# Altium integrated library BYTECH_HW_LIB_2019.IntLib: 907 symbols (part 4 of 6)
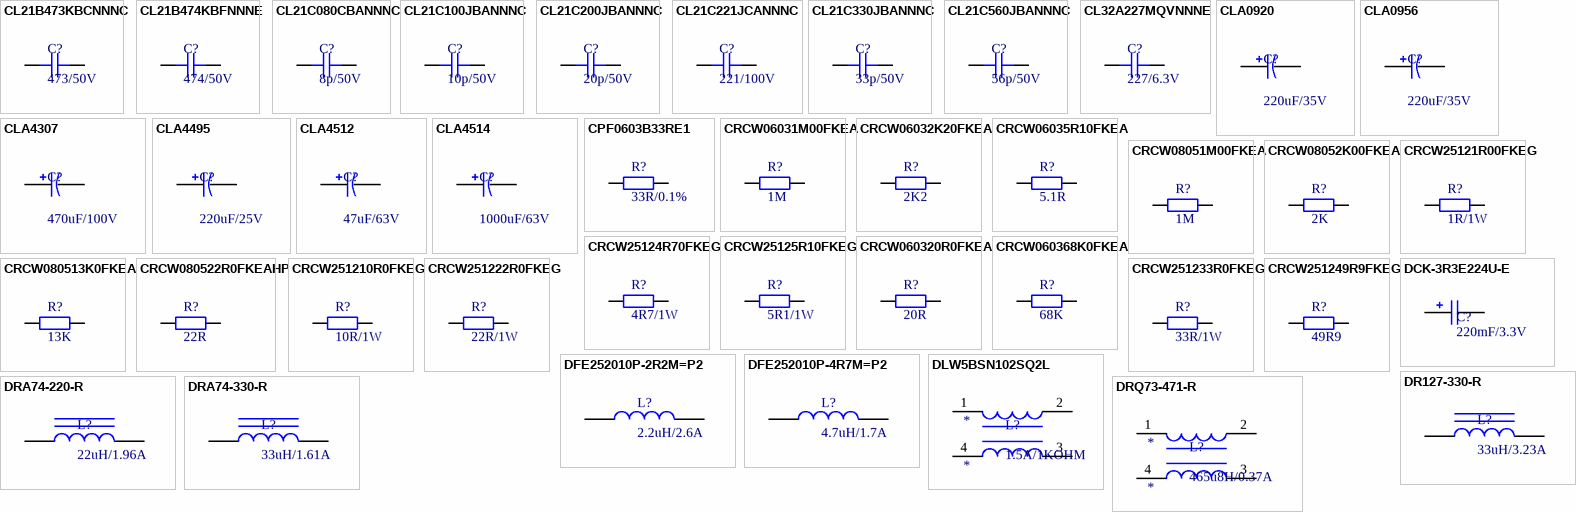
[diagram p42: symbols CL21B473KBCNNNC to DRQ73-471-R]

## CLA0920
designator C?, comment 220uF/35V
CAP ALUM 220uF 20% 10V RADIAL; MPN: CLA0920; Solder: WAVE; Value: 220uF/35V; Category: CAPACITOR; MFR_URL: http://linhkienchatluong.vn/tu-hoa-co-phan-cuc/tu-hoa-10v-220uf_sp454_ct825.aspx; PinCount: 2
footprint CAP_ALUM_D050_S20_H110
pins: 1, 2
1 alternate drawing of the same symbol

## CLA0956
designator C?, comment 220uF/35V
CAP ALUM 220uF 20% 35V RADIAL; MPN: CLA0956; Solder: WAVE; Value: 220uF/35V; Category: CAPACITOR; MFR_URL: https://linhkienchatluong.vn/tu-hoa-co-phan-cuc/tu-hoa-35v-220uf-8x12mm-tan-so-cao_sp454_ct929.aspx; PinCount: 2
footprint CAP_ALUM_D080_S35_H115
pins: 1, 2
1 alternate drawing of the same symbol

## CLA4307
designator C?, comment 470uF/100V
CAP ALUM 470uF 20% 100V RADIAL; MPN: CLA4307; Solder: WAVE; Value: 470uF/100V; Category: CAPACITOR; MFR_URL: http://linhkienchatluong.vn/tu-hoa-chat-luong-cao/tu-hoa-63v-47uf-nipponlelon-8x11mm_sp977_ct6500.aspx; PinCount: 2
footprint CAP_ALUM_D160_S75_H250
pins: 1, 2
1 alternate drawing of the same symbol

## CLA4495
designator C?, comment 220uF/25V
CAP ALUM 220uF 20% 25V RADIAL; MPN: CLA4495; Solder: WAVE; Value: 220uF/25V; Category: CAPACITOR; MFR_URL: http://linhkienchatluong.vn/tu-hoa-chat-luong-cao/tu-hoa-25v-220uf-elite-8x11mm_sp977_ct6482.aspx; PinCount: 2
footprint CAP_ALUM_D080_S35_H115
pins: 1, 2
1 alternate drawing of the same symbol

## CLA4512
designator C?, comment 47uF/63V
CAP ALUM 47uF 20% 63V RADIAL; MPN: CLA4512; Solder: WAVE; Value: 47uF/63V; Category: CAPACITOR; MFR_URL: http://linhkienchatluong.vn/tu-hoa-chat-luong-cao/tu-hoa-63v-47uf-nipponlelon-8x11mm_sp977_ct6500.aspx; PinCount: 2
footprint CAP_ALUM_D080_S35_H115
pins: 1, 2
1 alternate drawing of the same symbol

## CLA4514
designator C?, comment 1000uF/63V
CAP ALUM 1000uF 20% 63V RADIAL; MPN: CLA4514; Solder: WAVE; Value: 1000uF/63V; Category: CAPACITOR; MFR_URL: http://linhkienchatluong.vn/tu-hoa-chat-luong-cao/tu-hoa-63v-47uf-nipponlelon-8x11mm_sp977_ct6500.aspx; PinCount: 2
footprint CAP_ALUM_D160_S75_H250
pins: 1, 2
1 alternate drawing of the same symbol

## CPF0603B33RE1
designator R?, comment 33R/0.1%
RES SMD 33 OHM 0.1% 1/16W 0603; MPN: CPF0603B33RE1; CompanyID: VT-01175; Solder: SMT; Value: 33R/0.1%; Category: RESISTOR
footprint RESC-0603 (1608) (Resistor, Chip; 1.60 mm L X 0.80 mm W X 0.50 mm H body)
pins: 1, 2

## CRCW06031M00FKEA
designator R?, comment 1M
RES SMD 1M OHM 1% 1/10W 0603; MPN: CRCW06031M00FKEA; CompanyID: VT-00325; Solder: SMT; Value: 1M; Category: RESISTOR
footprint RESC-0603 (1608) (Resistor, Chip; 1.60 mm L X 0.80 mm W X 0.50 mm H body)
pins: 1, 2

## CRCW06032K20FKEA
designator R?, comment 2K2
RES SMD 2.2K OHM 1% 1/10W 0603; MPN: CRCW06032K20FKEA; CompanyID: VT-00776; Solder: SMT; Value: 2K2; Category: RESISTOR
footprint RESC-0603 (1608) (Resistor, Chip; 1.60 mm L X 0.80 mm W X 0.50 mm H body)
pins: 1, 2

## CRCW06035R10FKEA
designator R?, comment 5.1R
RES SMD 5.1 OHM 1% 1/10W 0603; MPN: CRCW06035R10FKEA; MFR: Vishay Dale; Solder: SMT; Value: 5.1R; Category: RESISTOR; PinCount: 2
footprint RESC-0603 (1608) (Resistor, Chip; 1.60 mm L X 0.80 mm W X 0.50 mm H body)
pins: 1, 2

## CRCW08051M00FKEA
designator R?, comment 1M
RES SMD 1M OHM 1% 1/8W 0805; MPN: CRCW08051M00FKEA; Solder: SMT; CompanyID: VT-00313; Value: 1M; Category: RESISTOR
footprint RESC-0805 (2012) (Resistor, Chip; 2.00 mm L X 1.25 mm W X 0.70 mm H body)
pins: 1, 2

## CRCW08052K00FKEA
designator R?, comment 2K
RES SMD 2K OHM 1% 1/8W 0805; MPN: CRCW08052K00FKEA; Solder: SMT; CompanyID: VT-00874; Value: 2K; Category: RESISTOR
footprint RESC-0805 (2012) (Resistor, Chip; 2.00 mm L X 1.25 mm W X 0.70 mm H body)
pins: 1, 2

## CRCW25121R00FKEG
designator R?, comment 1R/1W
RES SMD 1 OHM 1% 1W 2512; MPN: CRCW25121R00FKEG; Solder: SMT; Value: 1R/1W; Category: RESISTOR
footprint RESC-2512 (6432) (Chip Resistor, Body 6.3x3.2mm, IPC Medium Density)
pins: 1, 2

## CRCW25124R70FKEG
designator R?, comment 4R7/1W
RES SMD 4.7 OHM 1% 1W 2512; MPN: CRCW25124R70FKEG; MFR: Vishay Dale; Solder: SMT; Value: 4R7/1W; Category: RESISTOR; PinCount: 2
footprint RESC-2512 (6432) (Chip Resistor, Body 6.3x3.2mm, IPC Medium Density)
pins: 1, 2

## CRCW25125R10FKEG
designator R?, comment 5R1/1W
RES SMD 5.1 OHM 1% 1W 2512; MPN: CRCW25125R10FKEG; MFR: Vishay Dale; Solder: SMT; Value: 5R1/1W; Category: RESISTOR; PinCount: 2
footprint RESC-2512 (6432) (Chip Resistor, Body 6.3x3.2mm, IPC Medium Density)
pins: 1, 2

## CRCW060320R0FKEA
designator R?, comment 20R
RES SMD 20 OHM 1% 1/10W 0603; MPN: CRCW060320R0FKEA; CompanyID: VT-01023; Solder: SMT; Value: 20R; Category: RESISTOR
footprint RESC-0603 (1608) (Resistor, Chip; 1.60 mm L X 0.80 mm W X 0.50 mm H body)
pins: 1, 2

## CRCW060368K0FKEA
designator R?, comment 68K
RES SMD 68K OHM 1% 1/10W 0603; MPN: CRCW060368K0FKEA; CompanyID: VT-00323; Solder: SMT; Value: 68K; Category: RESISTOR
footprint RESC-0603 (1608) (Resistor, Chip; 1.60 mm L X 0.80 mm W X 0.50 mm H body)
pins: 1, 2

## CRCW080513K0FKEA
designator R?, comment 13K
RES SMD 13K OHM 1% 1/8W 0805; MPN: CRCW080513K0FKEA; Solder: SMT; CompanyID: VT-00011; Value: 13K; Category: RESISTOR
footprint RESC-0805 (2012) (Resistor, Chip; 2.00 mm L X 1.25 mm W X 0.70 mm H body)
pins: 1, 2

## CRCW080522R0FKEAHP
designator R?, comment 22R
RES SMD 22 OHM 1% 1/2W 0805; MPN: CRCW080522R0FKEAHP; Solder: SMT; CompanyID: VT-00213; Value: 22R; Category: RESISTOR
footprint RESC-0805 (2012) (Resistor, Chip; 2.00 mm L X 1.25 mm W X 0.70 mm H body)
pins: 1, 2

## CRCW251210R0FKEG
designator R?, comment 10R/1W
RES SMD 10 OHM 1% 1W 2512; MPN: CRCW251210R0FKEG; MFR: Vishay Dale; Solder: SMT; Value: 10R/1W; Category: RESISTOR; PinCount: 2
footprint RESC-2512 (6432) (Chip Resistor, Body 6.3x3.2mm, IPC Medium Density)
pins: 1, 2

## CRCW251222R0FKEG
designator R?, comment 22R/1W
RES SMD 22 OHM 1% 1W 2512; MPN: CRCW251222R0FKEG; MFR: Vishay Dale; Solder: SMT; Value: 22R/1W; Category: RESISTOR; PinCount: 2
footprint RESC-2512 (6432) (Chip Resistor, Body 6.3x3.2mm, IPC Medium Density)
pins: 1, 2

## CRCW251233R0FKEG
designator R?, comment 33R/1W
RES SMD 33 OHM 1% 1W 2512; MPN: CRCW251222R0FKEG; MFR: Vishay Dale; Solder: SMT; Value: 33R/1W; Category: RESISTOR; PinCount: 2
footprint RESC-2512 (6432) (Chip Resistor, Body 6.3x3.2mm, IPC Medium Density)
pins: 1, 2

## CRCW251249R9FKEG
designator R?, comment 49R9
RES SMD 49.9 OHM 1% 1W 2512; MPN: CRCW251249R9FKEG; Solder: SMT; CompanyID: VT-01314; Value: 49R9; Category: RESISTOR
footprint RESC-2512 (6432) (Chip Resistor, Body 6.3x3.2mm, IPC Medium Density)
pins: 1, 2

## DCK-3R3E224U-E
designator C?, comment 220mF/3.3V
CAP 220mF SUPER -20% +80% 3.3V SMD; MPN: DCK-3R3E224U-E; Solder: HAND; CompanyID: VT-00316; value: 220mF/3.3V; Category: CAPACITOR; PinCount: 2
footprint CAP-SUPER-0.22F
pins: 1, 2

## DFE252010P-2R2M=P2
designator L?, comment 2.2uH/2.6A
FIXED IND 2.2UH 2.6A 115 MOHM; MPN: DFE252010P-2R2M=P2; MFR: Murata Electronics; Solder: SMT; Value: 2.2uH/2.6A; Category: INDUCTOR; PinCount: 2
footprint IND-2520 (Footprint not found)
pins: 1, 2

## DFE252010P-4R7M=P2
designator L?, comment 4.7uH/1.7A
FIXED IND 4.7UH 1.7A 270 MOHM; MPN: DFE252010P-4R7M=P2; MFR: Murata Electronics; Solder: SMT; Value: 4.7uH/1.7A; Category: INDUCTOR; PinCount: 2
footprint IND-2520 (Footprint not found)
pins: 1, 2

## DLW5BSN102SQ2L
designator L?, comment 1.5A/1KOHM
IND- CMC 1.5A 2LN 1 KOHM SMD; MPN: DLW5BSN102SQ2L; CompanyID: VT-00918; Solder: SMT; Value: 1.5A/1KOHM; Category: INDUCTOR
footprint IND-DLW5B-5x5mm
pins: 1, 2, 3, 4

## DR127-330-R
designator L?, comment 33uH/3.23A
IND-FIXED 33uH 3.23A 60 MOHM SMD; MPN: DR127-330-R; CompanyID: VT-00905; Solder: SMT; Value: 33uH/3.23A; Category: INDUCTOR
footprint IND-DR127-330-R-12.5x12.5MM
pins: 1, 2

## DRA74-220-R
designator L?, comment 22uH/1.96A
IND-FIXED 22uH 1.96A 100 MOHM; MPN: DRA74-220-R; CompanyID: VT-00759; Solder: SMT; Value: 22uH/1.96A; Category: INDUCTOR
footprint IND-DRA74-220R-7.6X7.6MM (Inductor 7.6x7.6mm)
pins: 1, 2

## DRA74-330-R
designator L?, comment 33uH/1.61A
IND-FIXED 33uH 1.61A 0.151 OHM; MPN: DRA74-330-R; MFR: Coiltronics / Eaton; Solder: SMT; Value: 33uH/1.61A; Category: INDUCTOR
footprint IND-DRA74-220R-7.6X7.6MM (Inductor 7.6x7.6mm)
pins: 1, 2

## DRQ73-471-R
designator L?, comment 465u8H/0.37A
IND- ARRAY 2 COIL 465.8uH 0.37A SMD; MPN: DRQ73-471-R; Solder: SMT; CompanyID: VT-00758; Value: 465u8H/0.37A; Category: INDUCTOR
footprint INDUCTOR-RDQR73-7.6X7.6MM (Inductor 7.6x7.6mm)
pins: 1, 2, 3, 4

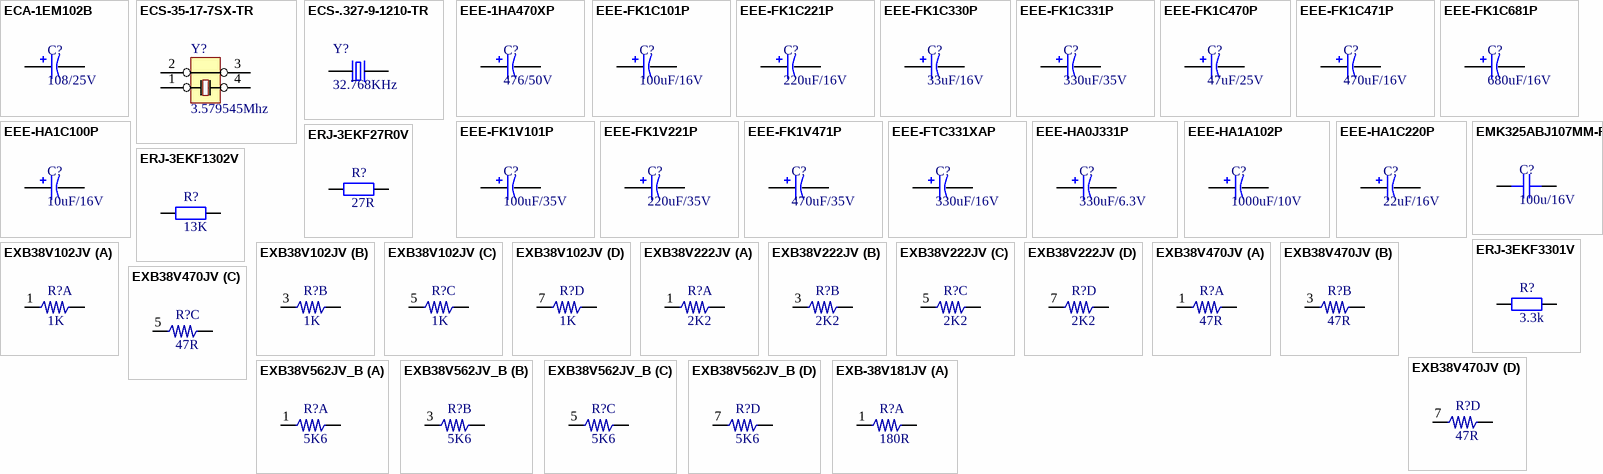
[diagram p21: symbols ECA-1EM102B to EXB-38V181JV]

## ECA-1EM102B
designator C?, comment 108/25V
CAP ALUM 1000uF 20% 25V RADIAL; MPN: ECA-1EM102B; Solder: WAVE; CompanyID: VT-00044; Value: 108/25V; Category: CAPACITOR; PinCount: 2
footprint CAP_ALUM_D100_S50_H200
pins: 1, 2

## ECS-35-17-7SX-TR
designator Y?, comment 3.579545Mhz
CRYSTAL 3.579545MHZ 17PF SMD; MPN: ECS-35-17-7SX-TR; MFR: ECS; Solder: SMT; Value: 3.579545Mhz; Category: CRYSTAL
footprint CRYSTAL_ABS25-32768_4P (CRYSTAL 32.768KHZ 6PF SMD)
pins: 1, 2, 3, 4

## ECS-.327-9-1210-TR
designator Y?, comment 32.768KHz
/ 32.768kHz ±20ppm Crystal 9pF 90 kOhms 2-SMD, No Lead /; MPN: ECS-.327-9-1210-TR; MFR: ECS Inc.; SnapEDA_Link: https://www.snapeda.com/parts/ECS-.327-9-1210-TR/ECS%20Inc./view-part/1592480/?ref=snap; Package: SMD-2 ECS International; Digi-Key_Purchase_URL: https://www.digikey.vn/product-detail/en/ecs-inc/ECS-.327-9-1210-TR/XC2283CT-ND/6821651?utm_source=snapeda&utm_medium=aggregator&utm_campaign=symbol; Digi-Key_Part_Number: XC2283CT-ND; Value: 32.768KHz; Category: Crystal
footprint *XTAL_ECS-.327-9-1210-TR
pins: 1 IN/OUT, 2 OUT/IN

## EEE-1HA470XP
designator C?, comment 476/50V
CAP ALUM 47uF 20% 50V SMD; MPN: EEE-1HA470XP; CompanyID: VT-00558; Solder: SMT; Value: 476/50V; Category: CAPACITOR; PinCount: 2
footprint CAP_ALUM_SMD_6354_TYPE_D8 (Capacitor, Aluminum Electrolytic; 6.60 mm L X 6.60 mm W X 8.00 mm H body)
pins: 1, 2

## EEE-FK1C101P
designator C?, comment 100uF/16V
CAP ALUM 100uF 20% 16V SMD; MPN: EEE-FK1C101P; MFR: Panasonic; Solder: SMT; Value: 100uF/16V; Category: CAPACITOR; PinCount: 2
footprint CAP_ALUM_SMD_6354_TYPE_D (Capacitor, Aluminum Electrolytic; 6.60 mm L X 6.60 mm W X 5.40 mm H body)
pins: 1, 2

## EEE-FK1C221P
designator C?, comment 220uF/16V
CAP ALUM 220uF 20% 16V SMD; MPN: EEE-FK1C221P; MFR: Panasonic; Solder: SMT; Value: 220uF/16V; Category: CAPACITOR; PinCount: 2
footprint CAP_ALUM_SMD_6377_TYPE_D8
pins: 1, 2

## EEE-FK1C330P
designator C?, comment 33uF/16V
CAP ALUM 33uF 20% 16V SMD; MPN: EEE-FK1C330P; MFR: Panasonic; Solder: SMT; Value: 33uF/16V; Category: CAPACITOR; PinCount: 2
footprint CAP_ALUM_SMD_5054_TYPE_C
pins: 1, 2

## EEE-FK1C331P
designator C?, comment 330uF/35V
CAP ALUM 330uF 20% 35V SMD; MPN: EEE-FK1C331P; MFR: Panasonic; Solder: SMT; Value: 330uF/35V; Category: CAPACITOR; PinCount: 2
footprint CAP_ALUM_SMD_100102_TYPE_G
pins: 1, 2

## EEE-FK1C470P
designator C?, comment 47uF/25V
CAP ALUM 47uF 20% 25V SMD; MPN: EEE-FK1C470P; MFR: Panasonic; Solder: SMT; Value: 47uF/25V; Category: CAPACITOR; PinCount: 2
footprint CAP_ALUM_SMD_6354_TYPE_D (Capacitor, Aluminum Electrolytic; 6.60 mm L X 6.60 mm W X 5.40 mm H body)
pins: 1, 2

## EEE-FK1C471P
designator C?, comment 470uF/16V
CAP ALUM 470uF 20% 16V SMD; MPN: EEE-FK1C471P; MFR: Panasonic; Solder: SMT; Value: 470uF/16V; Category: CAPACITOR; PinCount: 2
footprint CAP_ALUM_SMD_80102_TYPE_F
pins: 1, 2

## EEE-FK1C681P
designator C?, comment 680uF/16V
CAP ALUM 680uF 20% 16V SMD; MPN: EEE-FK1C681P; MFR: Panasonic; Solder: SMT; Value: 680uF/16V; Category: CAPACITOR; PinCount: 2
footprint CAP_ALUM_SMD_100102_TYPE_G
pins: 1, 2

## EEE-FK1V101P
designator C?, comment 100uF/35V
CAP ALUM 100uF 20% 35V SMD; MPN: EEE-FK1V101P; MFR: Panasonic; Solder: SMT; Value: 100uF/35V; Category: CAPACITOR; PinCount: 2
footprint CAP_ALUM_SMD_6377_TYPE_D8
pins: 1, 2

## EEE-FK1V221P
designator C?, comment 220uF/35V
CAP ALUM 220uF 20% 35V SMD; MPN: EEE-FK1V221P; MFR: Panasonic; Solder: SMT; Value: 220uF/35V; Category: CAPACITOR; PinCount: 2
footprint CAP_ALUM_SMD_80102_TYPE_F
pins: 1, 2

## EEE-FK1V471P
designator C?, comment 470uF/35V
CAP ALUM 470uF 20% 35V SMD; MPN: EEE-FK1V471P; MFR: Panasonic; Solder: SMT; Value: 470uF/35V; Category: CAPACITOR; PinCount: 2
footprint CAP_ALUM_SMD_100102_TYPE_G
pins: 1, 2

## EEE-FTC331XAP
designator C?, comment 330uF/16V
CAP ALUM 330uF 20% 16V SMD; MPN: EEE-FTC331XAP; MFR: Panasonic; CompanyID: VT-00564; Solder: SMT; Value: 330uF/16V; Category: CAPACITOR; PinCount: 2
footprint CAP_ALUM_SMD_6354_TYPE_D8 (Capacitor, Aluminum Electrolytic; 6.60 mm L X 6.60 mm W X 8.00 mm H body)
pins: 1, 2

## EEE-HA0J331P
designator C?, comment 330uF/6.3V
CAP ALUM 330uF 20% 6.3V SMD; MPN: EEE-HA0J331P; MFR: Panasonic; Solder: SMT; Value: 330uF/6.3V; Category: CAPACITOR; PinCount: 2
footprint CAP_ALUM_SMD_6377_TYPE_D8
pins: 1, 2

## EEE-HA1A102P
designator C?, comment 1000uF/10V
CAP ALUM 1000uF 20% 10V SMD; MPN: EEE-HA1A102P; MFR: Panasonic; Solder: SMT; Value: 1000uF/10V; Category: CAPACITOR; PinCount: 2
footprint CAP_ALUM_SMD_100102_TYPE_G
pins: 1, 2

## EEE-HA1C100P
designator C?, comment 10uF/16V
CAP ALUM 10uF 20% 16V SMD; MPN: EEE-HA1C100P; MFR: Panasonic; Solder: SMT; Value: 10uF/16V; Category: CAPACITOR; PinCount: 2
footprint CAP_ALUM_SMD_4054_TYPE_B
pins: 1, 2

## EEE-HA1C220P
designator C?, comment 22uF/16V
CAP ALUM 22uF 20% 16V SMD; MPN: EEE-HA1C220P; MFR: Panasonic; Solder: SMT; Value: 22uF/16V; Category: CAPACITOR; PinCount: 2
footprint CAP_ALUM_SMD_4054_TYPE_B
pins: 1, 2

## EMK325ABJ107MM-P
designator C?, comment 100u/16V
CAP CER 100UF 16V X5R 1210; MPN: EMK325ABJ107MM-P; MFR: Taiyo Yuden; Solder: SMT; Value: 100u/16V; Category: CAPACITOR; PinCount: 2
footprint CAPC-1210 (3225) (Resistor, Chip; 3.10 mm L X 2.60 mm W X 0.90 mm H body)
pins: 1, 2

## ERJ-3EKF27R0V
designator R?, comment 27R
RES SMD 27 OHM 1% 1/10W 0603; MPN: ERJ-3EKF27R0V; CompanyID: VT-xx; Solder: SMT; Value: 27R; Category: RESISTOR
footprint RESC-0603 (1608) (Resistor, Chip; 1.60 mm L X 0.80 mm W X 0.50 mm H body)
pins: 1, 2

## ERJ-3EKF1302V
designator R?, comment 13K
RES SMD 13K OHM 1% 1/10W 0603; MPN: ERJ-3EKF1302V; CompanyID: VT-00329; Solder: SMT; Value: 13K; Category: RESISTOR
footprint RESC-0603 (1608) (Resistor, Chip; 1.60 mm L X 0.80 mm W X 0.50 mm H body)
pins: 1, 2

## ERJ-3EKF3301V
designator R?, comment 3.3k
RES SMD 3.3k KOHM 1% 1/10W 0603; MPN: ERJ-3EKF3301V; CompanyID: VT-00776; Solder: SMT; Value: 3.3k; Category: RESISTOR
footprint RESC-0603 (1608) (Resistor, Chip; 1.60 mm L X 0.80 mm W X 0.50 mm H body)
pins: 1, 2

## EXB38V102JV
designator R?, comment 1K
RES ARRAY 4 RES 1K OHM 1206 (4X0603); MPN: EXB38V102JV; CompanyID: VT-00784; Solder: SMT; Value: 1K; Category: RESISTOR; PinCount: 8
footprint RESC_ARRAY_4x0603 (Resistor, Chip Array, 2 Side Convex, 0.80 mm pitch; 8 pin, 3.20 mm L X 1.60 mm W X 0.60 mm H body)
part A pins: 1, 2
part B pins: 3, 4
part C pins: 5, 6
part D pins: 7, 8

## EXB38V222JV
designator R?, comment 2K2
RES ARRAY 4 RES 2.2K OHM 1206 (4x0603); MPN: EXB38V222JV; Solder: SMT; Value: 2K2; CompanyID: *; Category: RESISTOR; PinCount: 8
footprint RESC_ARRAY_4x0603 (Resistor, Chip Array, 2 Side Convex, 0.80 mm pitch; 8 pin, 3.20 mm L X 1.60 mm W X 0.60 mm H body)
part A pins: 1, 2
part B pins: 3, 4
part C pins: 5, 6
part D pins: 7, 8

## EXB38V470JV
designator R?, comment 47R
RES ARRAY 4 RES 47 OHM 1206 (4x0603); MPN: EXB-38V470JV; Solder: SMT; Value: 47R; CompanyID: *; Category: RESISTOR; PinCount: 8
footprint RESC_ARRAY_4x0603 (Resistor, Chip Array, 2 Side Convex, 0.80 mm pitch; 8 pin, 3.20 mm L X 1.60 mm W X 0.60 mm H body)
part A pins: 1, 2
part B pins: 3, 4
part C pins: 5, 6
part D pins: 7, 8

## EXB38V562JV_B
designator R?, comment 5K6
RES ARRAY 4 RES 5.6K OHM 1206 (4x0603); MPN: EXB-38V562JV; Solder: SMT; CompanyID: *; Value: 5K6; Category: RESISTOR; PinCount: 8
footprint RESC_ARRAY_4x0603 (Resistor, Chip Array, 2 Side Convex, 0.80 mm pitch; 8 pin, 3.20 mm L X 1.60 mm W X 0.60 mm H body)
part A pins: 1, 2
part B pins: 3, 4
part C pins: 5, 6
part D pins: 7, 8

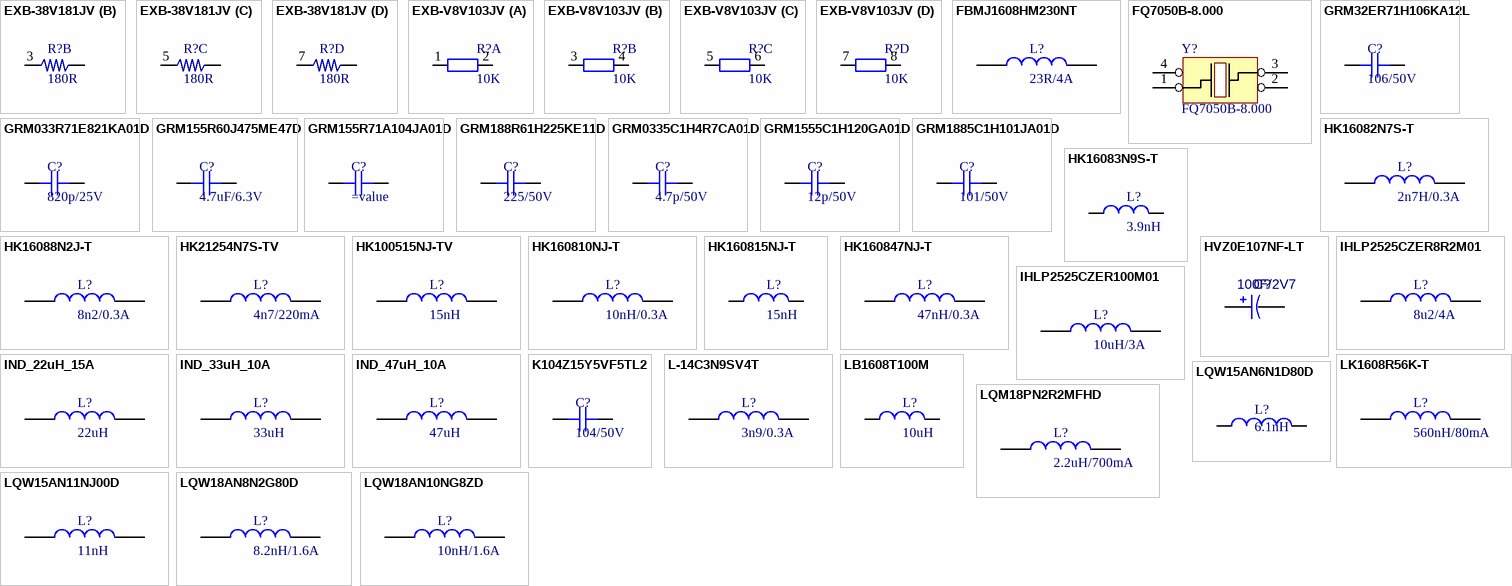
[diagram p22: symbols EXB-38V181JV to LQW18AN10NG8ZD]

## EXB-38V181JV
designator R?, comment 180R
RES ARRAY 4 RES 180 OHM 1206 (4x0603); MPN: EXB-38V181JV; CompanyID: VT-01022; Solder: SMT; Value: 180R; Category: RESISTOR; PinCount: 8
footprint RESC_ARRAY_4x0603 (Resistor, Chip Array, 2 Side Convex, 0.80 mm pitch; 8 pin, 3.20 mm L X 1.60 mm W X 0.60 mm H body)
part A pins: 1, 2
part B pins: 3, 4
part C pins: 5, 6
part D pins: 7, 8

## EXB-V8V103JV
designator R?, comment 10K
RES ARRAY 4 RES 10K OHM 1206 (4x0603); MPN: EXB-V8V103JV; CompanyID: VT-00783; Solder: SMT; Value: 10K; Category: RESISTOR; PinCount: 8
footprint RESC_ARRAY_4x0603 (Resistor, Chip Array, 2 Side Convex, 0.80 mm pitch; 8 pin, 3.20 mm L X 1.60 mm W X 0.60 mm H body)
part A pins: 1, 2
part B pins: 3, 4
part C pins: 5, 6
part D pins: 7, 8

## FBMJ1608HM230NT
designator L?, comment 23R/4A
IND-FERRITE BEAD 23 OHM  4A 0603 1LN; MPN: FBMJ1608HM230NT; CompanyID: VT-01060; Solder: SMT; Value: 23R/4A; Category: FERRITE BEAD; PinCount: 2
footprint IND-0603 (1608) (Resistor, Chip; 1.60 mm L X 0.80 mm W X 0.50 mm H body)
pins: 1, 2

## FQ7050B-8.000
designator Y?
CRYSTAL 8.0000MHZ 20PF SMD; CompanyID: VT-00294; Solder: SMT; Value: FQ7050B-8.000; MPN: FQ7050B-8.000; Category: CRYSTAL
footprint CRYSTAL_FQ7050B-8.000-SMD_4P-7x5MM (Crystal 7x5mm)
pins: 1, 2, 3, 4

## GRM32ER71H106KA12L
designator C?, comment 106/50V
CAP CER 10uF 10% 50V X7R 1210 (3255); MPN: GRM32ER71H106KA12L; CompanyID: VT-01019; Solder: SMT; Value: 106/50V; Category: CAPACITOR; PinCount: 2
footprint CAPC-1210 (3225) (Resistor, Chip; 3.10 mm L X 2.60 mm W X 0.90 mm H body)
pins: 1, 2

## GRM033R71E821KA01D
designator C?, comment 820p/25V
CAP CER 820PF 25V X7R 0201; MPN: GRM033R71E821KA01D; MPR: Murata Electronics; Sloder: SMD; Value: 820p/25V; Category: CAPACITOR
footprint CAPC-0201
pins: 1, 2

## GRM155R60J475ME47D
designator C?, comment 4.7uF/6.3V
CAP CER 4.7UF 6.3V X5R 0402; MFR: Murata Electronics; Solder: 0402; Value: 4.7uF/6.3V; MPN: CAP CER 4.7UF 6.3V X5R 0402; Category: Capacitor
footprint CAPC-0402 (1005) (Resistor Chip, Body 1.0x0.5mm, IPC High Density)
pins: 1, 2

## GRM155R71A104JA01D
designator C?
CAP CER 0.1UF 10V X7R 0402; MPN: GRM155R71A104JA01D; MFR: Murata Electronics; Sloder: 0402; Category: Capacitor
footprint CAPC-0402 (1005) (Resistor Chip, Body 1.0x0.5mm, IPC High Density)
pins: 1, 2

## GRM188R61H225KE11D
designator C?, comment 225/50V
CAP CER 2.2uF 10% 50V X5R 0603; MPN: GRM188R61H225KE11D; CompanyID: VT-00194; Solder: SMT; Value: 225/50V; Category: CAPACITOR; PinCount: 2
footprint CAPC-0603 (1608) (Resistor, Chip; 1.60 mm L X 0.80 mm W X 0.50 mm H body)
pins: 1, 2

## GRM0335C1H4R7CA01D
designator C?, comment 4.7p/50V
CAP CER 4.7PF 50V C0G/NP0 0201; MPN: GRM0335C1H4R7CA01D; MFR: Murata Electronics; Solder: SMT; Value: 4.7p/50V; Category: CAPACITOR; PinCount: 2
footprint CAPC-0603 (1608) (Resistor, Chip; 1.60 mm L X 0.80 mm W X 0.50 mm H body)
pins: 1, 2

## GRM1555C1H120GA01D
designator C?, comment 12p/50V
CAP CER 12PF 50V C0G/NP0 0402; MPN: GRM1555C1H120GA01D; MPR: Murata Electronics; Sloder: SMD; Category: CAPACITOR; VALUE: 12p/50V
footprint CAPC-0201
pins: 1, 2

## GRM1885C1H101JA01D
designator C?, comment 101/50V
CAP CER 100pF 5% 50V C0G/NP0 0603; MPN: GRM1885C1H101JA01D; CompanyID: VT-00947; Solder: SMT; Value: 101/50V; Category: CAPACITOR; PinCount: 2
footprint CAPC-0603 (1608) (Resistor, Chip; 1.60 mm L X 0.80 mm W X 0.50 mm H body)
pins: 1, 2

## HK16082N7S-T
designator L?, comment 2n7H/0.3A
IND-FIXED 2.7nH +- 0.3nH 300mA 100 mOhm 0603; MPN: HK16082N7S-T; CompanyID: VT-01163; Solder: SMT; Value: 2n7H/0.3A; Category: INDUCTOR
footprint IND-0603 (1608) (Resistor, Chip; 1.60 mm L X 0.80 mm W X 0.50 mm H body)
pins: 1, 2

## HK16083N9S-T
designator L?, comment 3.9nH
FIXED IND 3.9NH 300MA 140 MOHM; MPN: HK16083N9S-T; CompanyID: VT-01060; Solder: SMT; Value: 3.9nH; Category: FERRITE BEAD; PinCount: 2
footprint IND-0603 (1608) (Resistor, Chip; 1.60 mm L X 0.80 mm W X 0.50 mm H body)
pins: 1, 2

## HK16088N2J-T
designator L?, comment 8n2/0.3A
FIXED IND 8.2nH 300mA 240 mOHM; MPN: HK16088N2J-T; Solder: SMT; CompanyID: VT-01352; Value: 8n2/0.3A; Category: INDUCTOR
footprint INDUCTOR-0603 (Inductor, Chip; 1.60 mm L X 0.80 mm W X 1.40 mm H body)
pins: 1, 2

## HK21254N7S-TV
designator L?, comment 4n7/220mA
IND-FIXED 4.7nH 220mA 200 mOhm 0805; MPN: HK21254N7S-TV; Solder: SMT; CompanyID: VT-00954; Value: 4n7/220mA; Category: INDUCTOR
footprint INDUCTOR-0805 (Inductor, Chip; 2.00 mm L X 1.25 mm W X 1.50 mm H body)
pins: 1, 2

## HK100515NJ-TV
designator L?, comment 15nH
FIXED IND 15NH 300MA 460 MOHM; MPN: HK100515NJ-TV; MFR: Taiyo Yuden; Sloder: 0402; Value: 15nH; Category: Inductor; Digikey MPN: 587-3998-1-ND
footprint IND-0402 (1005) (Resistor Chip, Body 1.0x0.5mm, IPC High Density)
pins: 1, 2

## HK160810NJ-T
designator L?, comment 10nH/0.3A
IND-FIXED 10nH 5% 300mA 260 mOhm 0603; MPN: HK160810NJ-T; CompanyID: VT-01233; Solder: SMT; Value: 10nH/0.3A; Category: INDUCTOR
footprint INDUCTOR-0603 (Inductor, Chip; 1.60 mm L X 0.80 mm W X 1.40 mm H body)
pins: 1, 2

## HK160815NJ-T
designator L?, comment 15nH
FIXED IND 15NH 300MA 320 MOHM; MPN: HK160815NJ-T; CompanyID: VT-01060; Solder: SMT; Value: 15nH; Category: FERRITE BEAD; PinCount: 2
footprint IND-0603 (1608) (Resistor, Chip; 1.60 mm L X 0.80 mm W X 0.50 mm H body)
pins: 1, 2

## HK160847NJ-T
designator L?, comment 47nH/0.3A
IND-FIXED 47nH 300mA 700 mOhm 0603; MPN: HK160847NJ-T; Solder: SMT; CompanyID: VT-01263; Value: 47nH/0.3A; Category: INDUCTOR
footprint IND-0603 (1608) (Resistor, Chip; 1.60 mm L X 0.80 mm W X 0.50 mm H body)
pins: 1, 2

## HVZ0E107NF-LT
designator C?, comment 100F/2V7
2V7 100F ESR=30Ohms; MPN: HVZ0E107NF-LT; Solder: HAND; CompanyID: VT-01310; Value: 100F/2V7; Category: CAPACITOR; PinCount: 2
footprint CAP_ALUM_D12.5_S5.0 - L35 FLAT
pins: 1, 2

## IHLP2525CZER8R2M01
designator L?, comment 8u2/4A
IND FIXED 8.2uH 4A 68 mOhm SMD; MPN: IHLP2525CZER8R2M01; Solder: SMT; CompanyID: VT-00431; Value: 8u2/4A; Category: INDUCTOR
footprint INDUCTOR - IHLP2525-6.86X6.47MM
pins: 1, 2

## IHLP2525CZER100M01
designator L?, comment 10uH/3A
IND-FIXED 10uH 3A 105 mOhm SMD; MPN: IHLP2525CZER100M01; Solder: SMT; CompanyID: VT-01095; Value: 10uH/3A; Category: INDUCTOR
footprint INDUCTOR - IHLP2525-6.86X6.47MM
pins: 1, 2

## IND_22uH_15A
designator L?, comment 22uH
FIXED IND 22UH 15A 7 MOHM 20x10mm; MPN: IND_22uH_15A; Value: 22uH; Category: INDUCTOR; PinCount: 2; ComponentLink1Description: MFR Link; ComponentLink1URL: https://item.taobao.com/item.htm?spm=a230r.1.14.40.67d1582cjSsbUh&id=591345290045
footprint IND-20x10mm_TH (Footprint not found)
pins: 1, 2

## IND_33uH_10A
designator L?, comment 33uH
FIXED IND 33UH 10A 7 MOHM 20x10mm; MPN: IND_33uH_10A; Value: 33uH; Category: INDUCTOR; PinCount: 2; ComponentLink1Description: MFR Link; ComponentLink1URL: https://item.taobao.com/item.htm?spm=a230r.1.14.40.67d1582cjSsbUh&id=591345290045
footprint IND-20x10mm_TH (Footprint not found)
pins: 1, 2

## IND_47uH_10A
designator L?, comment 47uH
FIXED IND 47UH 10A 7 MOHM 20x10mm; MPN: IND_47uH_10A; Value: 47uH; Category: INDUCTOR; PinCount: 2; ComponentLink1Description: MFR Link; ComponentLink1URL: https://item.taobao.com/item.htm?spm=a230r.1.14.40.67d1582cjSsbUh&id=591345290045
footprint IND-20x10mm_TH (Footprint not found)
pins: 1, 2

## K104Z15Y5VF5TL2
designator C?, comment 104/50V
CAP CER 0.1uF -20 +80% 50V Y5V RADIAL; MPN: K104Z15Y5VF5TL2; CompanyID: VT-00189; Solder: WAVE; Value: 104/50V; Category: CAPACITOR; PinCount: 2
footprint CAP_CER_TH100 (Ceramic Cap, 10,18,22,27,33pF)
pins: 1, 2

## L-14C3N9SV4T
designator L?, comment 3n9/0.3A
IND-FIXED 3.9nH  +-0.3nH 300mA 200 mOhm 0603; MPN: L-14C3N9SV4T; Solder: SMT; CompanyID: VT-01164; Value: 3n9/0.3A; Category: INDUCTOR
footprint INDUCTOR-0603 (Inductor, Chip; 1.60 mm L X 0.80 mm W X 1.40 mm H body)
pins: 1, 2

## LB1608T100M
designator L?, comment 10uH
FIXED IND 10UH 60MA 700 MOHM SMD; MPN: LB1608T100M; CompanyID: VT-01060; Solder: SMT; Value: 10uH; Category: FERRITE BEAD; PinCount: 2
footprint IND-0603 (1608) (Resistor, Chip; 1.60 mm L X 0.80 mm W X 0.50 mm H body)
pins: 1, 2

## LK1608R56K-T
designator L?, comment 560nH/80mA
FIXED IND 560NH 80MA 10% 1.05 OHM; MPN: LK1608R56K-T; CompanyID: VT-01330; Solder: SMT; Value: 560nH/80mA; Category: INDUCTOR
footprint INDUCTOR-0603 (Inductor, Chip; 1.60 mm L X 0.80 mm W X 1.40 mm H body)
pins: 1, 2

## LQM18PN2R2MFHD
designator L?, comment 2.2uH/700mA
FIXED IND 2.2UH 700MA 375 MOHM; MPN: LQM18PN2R2MFHD; MFR: Murata Electronics; Solder: SMT; Value: 2.2uH/700mA; Category: INDUCTOR
footprint IND-0603 (1608) (Resistor, Chip; 1.60 mm L X 0.80 mm W X 0.50 mm H body)
pins: 1, 2

## LQW15AN6N1D80D
designator L?, comment 6.1nH
FIXED IND 6.1nH 56mA 56 MOhm SMD; MPN: LQW15AN6N1D80D; Solder: SMT; CompanyID: VT-xxxxx; Value: 6.1nH; Category: INDUCTOR
footprint IND_0402 (Capacitor, Chip; 1.829 mm L X 0.61 mm W X 0.55 mm H body)
pins: 1, 2

## LQW15AN11NJ00D
designator L?, comment 11nH
FIXED IND 11NH 500MA 140 MOHM; MPN: LQW15AN11NJ00D; MFR: Murata Electronics; Solder: 0402; value: 11nH; Category: Inductor
footprint IND-0402 (0506) (Resistor Chip, Body 1.0x0.5mm, IPC High Density)
pins: 1, 2

## LQW18AN8N2G80D
designator L?, comment 8.2nH/1.6A
FIXED IND 8.2NH 1.6A 52 MOHM 0603 SMD; MPN: LQW18AN8N2G80D; MFR: Murata Electronics; Solder: SMT; Value: 8.2nH/1.6A; Category: INDUCTOR; PinCount: 2
footprint IND-0603 (1608) (Resistor, Chip; 1.60 mm L X 0.80 mm W X 0.50 mm H body)
pins: 1, 2

## LQW18AN10NG8ZD
designator L?, comment 10nH/1.6A
FIXED IND 10NH 1.6A 52 MOHM 0805 SMD; MPN: LQW18AN10NG8ZD; MFR: Murata Electronics; Solder: SMT; Value: 10nH/1.6A; Category: INDUCTOR; PinCount: 2
footprint IND-0805 (2012) (Resistor, Chip; 2.00 mm L X 1.25 mm W X 0.70 mm H body)
pins: 1, 2

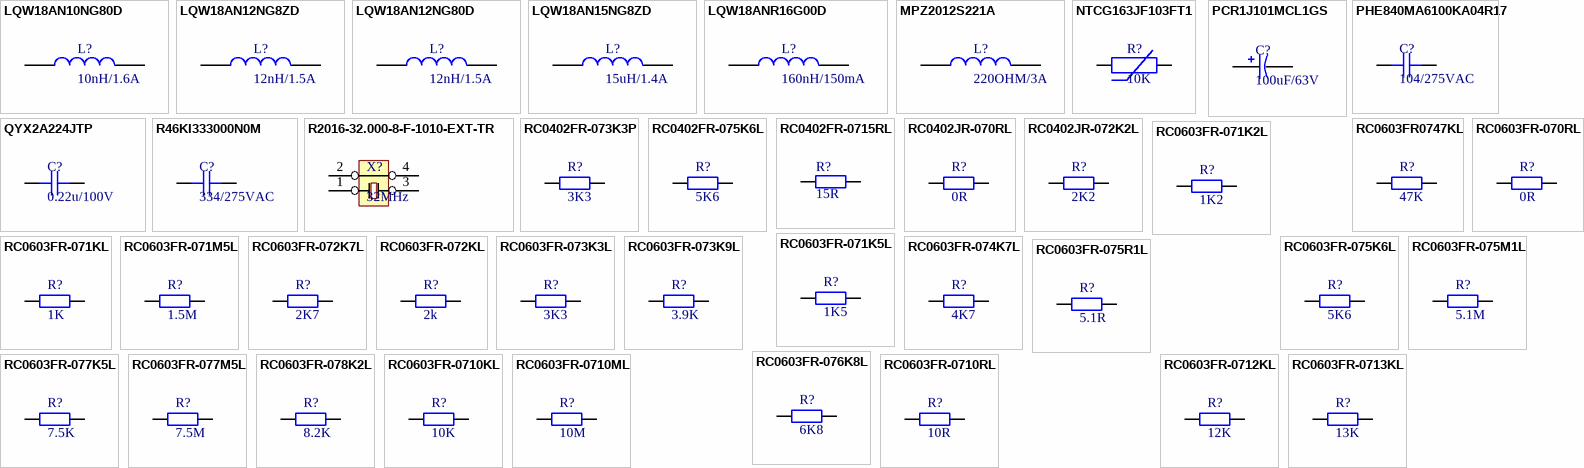
[diagram p23: symbols LQW18AN10NG80D to RC0603FR-0713KL]

## LQW18AN10NG80D
designator L?, comment 10nH/1.6A
FIXED IND 10NH 1.6A 52 MOHM 0603 SMD; MPN: LQW18AN10NG80D; MFR: Murata Electronics; Solder: SMT; Value: 10nH/1.6A; Category: INDUCTOR; PinCount: 2
footprint IND-0603 (1608) (Resistor, Chip; 1.60 mm L X 0.80 mm W X 0.50 mm H body)
pins: 1, 2

## LQW18AN12NG8ZD
designator L?, comment 12nH/1.5A
FIXED IND 12NH 1.5A 64 MOHM 0808 SMD; MPN: LQW18AN12NG8ZD; MFR: Murata Electronics; Solder: SMT; Value: 12nH/1.5A; Category: INDUCTOR; PinCount: 2
footprint IND-0805 (2012) (Resistor, Chip; 2.00 mm L X 1.25 mm W X 0.70 mm H body)
pins: 1, 2

## LQW18AN12NG80D
designator L?, comment 12nH/1.5A
FIXED IND 12NH 1.5A 64 MOHM 0603 SMD; MPN: LQW18AN12NG80D; MFR: Murata Electronics; Solder: SMT; Value: 12nH/1.5A; Category: INDUCTOR; PinCount: 2
footprint IND-0603 (1608) (Resistor, Chip; 1.60 mm L X 0.80 mm W X 0.50 mm H body)
pins: 1, 2

## LQW18AN15NG8ZD
designator L?, comment 15uH/1.4A
FIXED IND 15NH 1.4A 75 MOHM 0805 SMD; MPN: LQW18AN15NG8ZD; MFR: Murata Electronics; Solder: SMT; Value: 15uH/1.4A; Category: INDUCTOR; PinCount: 2
footprint IND-0805 (2012) (Resistor, Chip; 2.00 mm L X 1.25 mm W X 0.70 mm H body)
pins: 1, 2

## LQW18ANR16G00D
designator L?, comment 160nH/150mA
FIXED IND 160NH 150MA 2.1 OHM 0603 SMD; MPN: LQW18ANR16G00D; MFR: Murata Electronics; CompanyID: VT-01329; Solder: SMT; Value: 160nH/150mA; Category: INDUCTOR; PinCount: 2
footprint IND-0603 (1608) (Resistor, Chip; 1.60 mm L X 0.80 mm W X 0.50 mm H body)
pins: 1, 2

## MPZ2012S221A
designator L?, comment 220OHM/3A
IND-FERRITE BEAD 220 OHM 0805 1LN; MPN: MPZ2012S221A; CompanyID: VT-00253; Solder: SMT; Value: 220OHM/3A; Category: FERRITE BEAD; PinCount: 2
footprint IND-0805 (2012) (Resistor, Chip; 2.00 mm L X 1.25 mm W X 0.70 mm H body)
pins: 1, 2

## NTCG163JF103FT1
designator R?, comment 10K
THERMISTOR 10K OHM 1% 0603; MPN: NTCG163JF103FT1; CompanyID: VT-01145; Solder: SMT; Value: 10K; Category: RESISTOR
footprint RESC-0603 (1608) (Resistor, Chip; 1.60 mm L X 0.80 mm W X 0.50 mm H body)
pins: 1, 2

## PCR1J101MCL1GS
designator C?, comment 100uF/63V
CAP ALUM POLY 100UF 20% 63V SMD; MPN: PCR1J101MCL1GS; MFR: Nichicon; Solder: SMT; Value: 100uF/63V; Category: CAPACITOR; PinCount: 2
footprint CAP_ALUM_SMD_100102_TYPE_G
pins: 1, 2

## PHE840MA6100KA04R17
designator C?, comment 104/275VAC
CAP FILM 0.1UF 10% 760VDC RADIAL; MPN: PHE840MA6100KA04R17; MFR: KEMET; Solder: WAVE; Value: 104/275VAC; Category: CAPACITOR; PinCount: 2
footprint CAPF-13x12x6-P10 (Footprint not found)
pins: 1, 2

## QYX2A224JTP
designator C?, comment 0.22u/100V
CAP FILM 0.22UF 5% 100VDC RADIAL; MPN: QYX2A224JTP; MFR: Nichicon; Solder: WAVE; Value: 0.22u/100V; Category: CAPACITOR; PinCount: 2
footprint CAP_FILM_7.5
pins: 1, 2

## R46KI333000N0M
designator C?, comment 334/275VAC
CAP FILM 0.33UF 20% 560VDC RAD; MPN: R46KI333000N0M; MFR: KEMET; Solder: WAVE; Value: 334/275VAC; Category: CAPACITOR; PinCount: 2
footprint CAPF-18x15x8.5-P15 (Footprint not found)
pins: 1, 2

## R2016-32.000-8-F-1010-EXT-TR
designator X?, comment 32MHz
XTAL 32MHZ 8PF SMD; MPN: R2016-32.000-8-F-1010-EXT-TR; MPR: Raltron Electronics; Sloder: SMT; Value: 32MHz; Category: CRYSTAL
footprint CRYSTAL-XRCGB27M120F3M10R0 (2x1.6) (Crystal 2x1.6mm)
pins: 1, 2, 3, 4

## RC0402FR-073K3P
designator R?, comment 3K3
RES SMD 3.3K OHM 1% 1/16W 0402; MPN: RC0402FR-073K3P; MPR: Yageo; Sloder: 0402; Manufacturer: Yageo; Category: Resistor; Value: 3K3
footprint RESC-0402 (1005) (Resistor Chip, Body 1.0x0.5mm, IPC High Density)
pins: 1, 2

## RC0402FR-075K6L
designator R?, comment 5K6
RES SMD 5.6K OHM 1% 1/16W 0402; MPN: RC0402FR-075K6L; MPR: Yageo; Sloder: 0402; Manufacturer: Yageo; Category: Resistor; Value: 5K6
footprint CAPC-0402 (1005) (Resistor Chip, Body 1.0x0.5mm, IPC High Density)
pins: 1, 2

## RC0402FR-0715RL
designator R?, comment 15R
RES SMD 15 OHM 1% 1/16W 0402; MPN: RC0402FR-0715RL; Solder: SMT; Value: 15R; Category: RESISTOR
footprint RESC-0603 (1608) (Resistor, Chip; 1.60 mm L X 0.80 mm W X 0.50 mm H body)
pins: 1, 2

## RC0402JR-070RL
designator R?, comment 0R
RES SMD 0 OHM JUMPER 1/16W 0402; MPN: RC0402JR-070RL; MFR: Yageo; Solder: 0402; Value: 0R; Category: Resistor
footprint RESC-0402 (1005) (Resistor Chip, Body 1.0x0.5mm, IPC High Density)
pins: 1, 2

## RC0402JR-072K2L
designator R?, comment 2K2
RES SMD 2.2K OHM 5% 1/16W 0402; MPN: RC0402JR-072K2L; MPR: Yageo; Sloder: 0402; Manufacturer: Yageo; Category: Resistor; Value: 2K2
footprint RESC-0402 (1005) (Resistor Chip, Body 1.0x0.5mm, IPC High Density)
pins: 1, 2

## RC0603FR0747KL
designator R?, comment 47K